# Altium footprint library tsl_Pcblib.PcbLib: 219 footprints (part 14 of 14)
Each footprint in its own frame and in the unit in brackets; x right, y up, seen from the top. Pads: shape width x height; smd on the part's side, far side on the other; paste and mask are expansions set on the pad; w line width, h text height; cw(c..) or ccw(c..) is an arc to the next point about the centre after c.
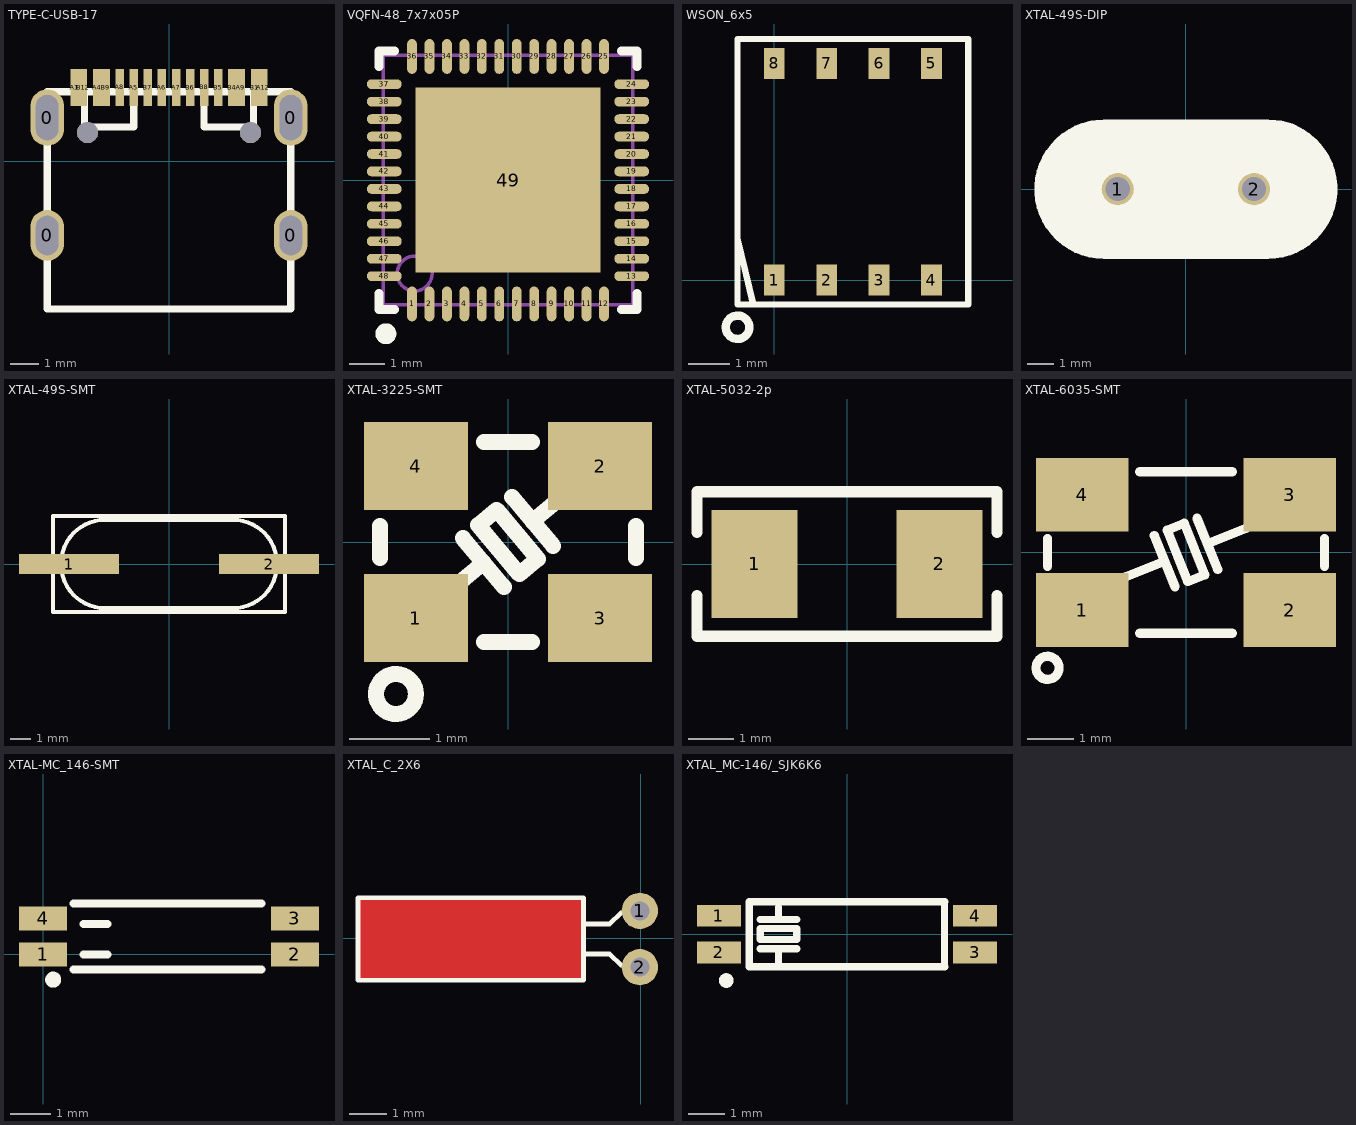
[diagram p13: the footprints below, top view; thin cyan lines are the x and y axes]

## TYPE-C-USB-17 [mm]
pads (22):
  oval 1.2x1.8 hole 0.8 slot 1.4 at 90 deg: 0(-4.32,-2.624) 0(4.32,-2.624)
  oval 1.2x2 hole 0.8 slot 1.6 at 90 deg: 0(-4.32,1.556) 0(4.32,1.556)
  rect 0.3x1.3 smd: A1(-3.35,2.623) A4(-2.55,2.623) A5(-1.25,2.623) A6(-0.25,2.623) A7(0.25,2.623) A8(-1.75,2.624) A9(2.55,2.623) A12(3.35,2.623) B1(3.05,2.623) B4(2.25,2.623) B5(1.75,2.623) B6(0.75,2.623) B7(-0.75,2.623) B8(1.25,2.624) B9(-2.25,2.623) B12(-3.05,2.623)
  round 0.75 hole 0.75 unplated: ""(-2.89,1.026) ""(2.89,1.026)
Top Overlay:
  lines w0.254: -3,2.471 -3,1.221 -1.25,1.221 -1.25,2.471 ; 1.247,2.473 1.247,1.223 2.997,1.223 2.997,2.473 ; -4.32,-5.227 -4.32,2.471 4.32,2.471 4.32,-5.227 -4.32,-5.227

## VQFN-48_7x7x05P [mm]
pads (49):
  oval 0.28x1 smd paste-0.025 mask+0.051: 1(-2.75,-3.545) 2(-2.25,-3.545) 3(-1.75,-3.545) 4(-1.25,-3.545) 5(-0.75,-3.545) 6(-0.25,-3.545) 7(0.25,-3.545) 8(0.75,-3.545) 9(1.25,-3.545) 10(1.75,-3.545) 11(2.25,-3.545) 12(2.75,-3.545) 25(2.75,3.545) 26(2.25,3.545) 27(1.75,3.545) 28(1.25,3.545) 29(0.75,3.545) 30(0.25,3.545) 31(-0.25,3.545) 32(-0.75,3.545) 33(-1.25,3.545) 34(-1.75,3.545) 35(-2.25,3.545) 36(-2.75,3.545)
  oval 1x0.28 smd paste-0.025 mask+0.051: 13(3.545,-2.75) 14(3.545,-2.25) 15(3.545,-1.75) 16(3.545,-1.25) 17(3.545,-0.75) 18(3.545,-0.25) 19(3.545,0.25) 20(3.545,0.75) 21(3.545,1.25) 22(3.545,1.75) 23(3.545,2.25) 24(3.545,2.75) 37(-3.545,2.75) 38(-3.545,2.25) 39(-3.545,1.75) 40(-3.545,1.25) 41(-3.545,0.75) 42(-3.545,0.25) 43(-3.545,-0.25) 44(-3.545,-0.75) 45(-3.545,-1.25) 46(-3.545,-1.75) 47(-3.545,-2.25) 48(-3.545,-2.75)
  rect 5.3x5.3 smd paste-2.65 mask+0.051: 49(0,0)
Top Overlay:
  circle w0.3: c-3.5,-4.4 r0.15
  lines w0.254: -3.7,-3.25 -3.7,-3.7 -3.25,-3.7 ; -3.7,3.25 -3.7,3.7 -3.25,3.7 ; 3.25,-3.7 3.7,-3.7 3.7,-3.25 ; 3.25,3.7 3.7,3.7 3.7,3.25
Top Paste:
  rectangle: 0.1,0.1 1.2,1.2
  rectangle: 0.1,1.4 1.2,2.55
  rectangle: 1.4,0.1 2.55,1.2
  rectangle: 1.4,1.4 2.55,2.55
  region: -1.4,2.55 -2.55,2.55 -2.55,1.4 -1.4,1.4
  region: -1.4,1.2 -2.55,1.2 -2.55,0.1 -1.4,0.1
  region: -0.1,2.55 -1.2,2.55 -1.2,1.4 -0.1,1.4
  region: -0.1,1.2 -1.2,1.2 -1.2,0.1 -0.1,0.1
  region: -2.55,-1.4 -2.55,-2.55 -1.4,-2.55 -1.4,-1.4
  region: -1.225,-1.425 -1.225,-2.525 -0.075,-2.525 -0.075,-1.425
  region: -2.525,-0.075 -2.525,-1.225 -1.425,-1.225 -1.425,-0.075
  region: -1.2,-0.1 -1.2,-1.2 -0.1,-1.2 -0.1,-0.1
  region: 1.4,-1.4 1.4,-2.55 2.55,-2.55 2.55,-1.4
  region: 0.075,-1.425 0.075,-2.525 1.225,-2.525 1.225,-1.425
  region: 1.425,-0.075 1.425,-1.225 2.525,-1.225 2.525,-0.075
  region: 0.1,-0.1 0.1,-1.2 1.2,-1.2 1.2,-0.1
Mechanical 13:
  circle w0.1: c-2.675,-2.675 r0.5
  lines w0.1: -3.575,-3.575 -3.575,3.575 3.575,3.575 3.575,-3.575 -3.575,-3.575

## WSON_6x5 [mm]
pads (8):
  rect 0.5x0.75 smd: 1(0,0) 2(1.27,0) 3(2.54,0) 4(3.81,0) 5(3.81,5.25) 6(2.54,5.25) 7(1.27,5.25) 8(0,5.25)
Top Overlay:
  circle w0.203: c-0.889,-1.143 r0.284
  lines w0.152: -0.889,1.016 -0.508,-0.592 ; -0.889,-0.592 4.699,-0.592 4.699,5.842 -0.889,5.842 -0.889,-0.592

## XTAL-49S-DIP [mm]
pads (2):
  round 1.2 / inner round 1.2 / far side round 1.6 hole 0.9: 1(-2.54,0) 2(2.54,0)
Top Overlay:
  region: -3.538,2.546 3.577,2.55 3.97,2.431 4.424,2.188 4.822,1.862 5.148,1.464 5.391,1.01 5.54,0.518 5.59,0.006 5.54,-0.506 5.391,-0.998 5.148,-1.452 4.822,-1.85 4.424,-2.176 3.97,-2.419 3.572,-2.539 3.574,-2.534 -3.539,-2.541 -3.97,-2.41 -4.422,-2.169 -4.819,-1.843 -5.144,-1.447 -5.386,-0.995 -5.534,-0.504 -5.585,0.006 -5.534,0.516 -5.386,1.007 -5.144,1.459 -4.819,1.855 -4.422,2.181 -3.97,2.422 -3.539,2.553
  lines w0.2: -3.048,-2.5 cw(c-3.048,0) -3.048,2.5 3.048,2.5 cw(c3.048,0) 3.048,-2.5 -3.048,-2.5
3D body "Crystal PTH HC49S.STEP": height 3.63, standoff -1.97, extent -5.551,-2.325 5.621,2.348

## XTAL-49S-SMT [mm]
pads (2):
  rect 5x1 smd: 1(-5,0) 2(5,0)
Top Overlay:
  lines w0.2: -3.19,-2.21 cw(c-3.19,0) -3.19,2.21 3.19,2.21 cw(c3.19,0) 3.19,-2.21 -3.19,-2.21
  lines w0.203: -5.8,-2.4 -5.8,2.4 5.8,2.4 5.8,-2.4 -5.8,-2.4

## XTAL-3225-SMT [mm]
pads (4):
  rect 1.3x1.1 smd: 1(-1.15,-0.95) 2(1.15,0.95) 3(1.15,-0.95) 4(-1.15,0.95)
Top Overlay:
  circle w0.2: c-1.4,-1.9 r0.25
  lines w0.2: -1.6,-0.2 -1.6,0.2 ; -0.766,-0.643 -0.306,-0.257 ; -0.564,0.049 -0.049,-0.564 ; -0.3,-1.25 0.3,-1.25 ; -0.3,1.25 0.3,1.25 ; 0.049,0.564 0.564,-0.049 ; 0.306,0.257 0.766,0.643 ; 1.6,-0.2 1.6,0.2 ; -0.372,0.21 0.142,-0.403 0.372,-0.21 -0.142,0.403 -0.372,0.21
3D body "Crystal Oscillator 3225.step": height 0.61, standoff 0, extent -1.6,-1.27 1.6,1.23

## XTAL-5032-2p [mm]
pads (2):
  rect 1.9x2.4 smd: 1(-2.05,0) 2(2.05,0)
Top Overlay:
  lines w0.254: -3.325,-0.7 -3.325,-1.6 3.325,-1.6 3.325,-0.7 ; -3.325,0.7 -3.325,1.6 3.325,1.6 3.325,0.7

## XTAL-6035-SMT [mm]
pads (4):
  rect 2x1.6 smd: 1(-2.25,-1.25) 2(2.25,-1.25) 3(2.25,1.25) 4(-2.25,1.25)
Top Overlay:
  circle w0.2: c-3,-2.5 r0.25
  lines w0.2: -3,-0.3 -3,0.3 ; -1.298,-0.524 -0.464,-0.187 ; -1,-1.75 1,-1.75 ; -1,1.75 1,1.75 ; -0.688,0.369 -0.239,-0.744 ; 0.239,0.744 0.688,-0.369 ; 0.464,0.187 1.298,0.524 ; 3,-0.3 3,0.3 ; -0.41,0.481 0.039,-0.631 0.41,-0.481 -0.039,0.631 -0.41,0.481

## XTAL-MC_146-SMT [mm]
pads (4):
  rect 1.2x0.6 smd: 1(0,0) 2(6.3,0) 3(6.3,0.9) 4(0,0.9)
Top Overlay:
  circle w0.2: c0.254,-0.635 r0.1
  lines w0.2: 0.762,-0.381 5.461,-0.381 ; 0.762,1.27 5.461,1.27 ; 1.016,0 1.616,0 ; 1.016,0.762 1.616,0.762

## XTAL_C_2X6 [mil]
pads (2):
  round 38 hole 20: 1(-1,28.53) 2(-1,-30.53)
Top Layer:
  rectangle: -296.28,-42.34 -60.06,40.34
Top Overlay:
  lines w5: -280.53,-44.31 -296.28,-44.31 ; -60.06,-16.75 -32.5,-16.75 -20.68,-28.56 ; -20.68,26.56 -32.5,14.75 -60.06,14.75 ; -296.28,-44.31 -296.28,42.31 -60.06,42.31 -60.06,14.75 ; -296.28,-44.31 -60.06,-44.31 -60.06,14.75

## XTAL_MC-146/_SJK6K6 [mm]
pads (4):
  rect 1.2x0.6 smd: 1(-3.5,0.5) 2(-3.5,-0.5) 3(3.5,-0.5) 4(3.5,0.5)
Top Overlay:
  circle w0.2: c-3.302,-1.27 r0.1
  lines w0.2: -2.373,-0.4 -1.373,-0.4 ; -2.373,0.4 -1.373,0.4 ; -1.873,-0.841 -1.873,-0.408 ; -1.873,0.419 -1.873,0.742 ; 2.667,-0.889 2.667,0.889 ; -2.373,-0.15 -1.373,-0.15 -1.373,0.15 -2.373,0.15 -2.373,-0.15
  lines w0.203: 2.667,-0.889 -2.667,-0.889 -2.667,0.889 2.667,0.889